# Altium footprint library LTEWlib.PcbLib: 125 footprints (part 3 of 8)
Each footprint in its own frame and in the unit in brackets; x right, y up, seen from the top. Pads: shape width x height; smd on the part's side, far side on the other; paste and mask are expansions set on the pad; w line width, h text height; cw(c..) or ccw(c..) is an arc to the next point about the centre after c.
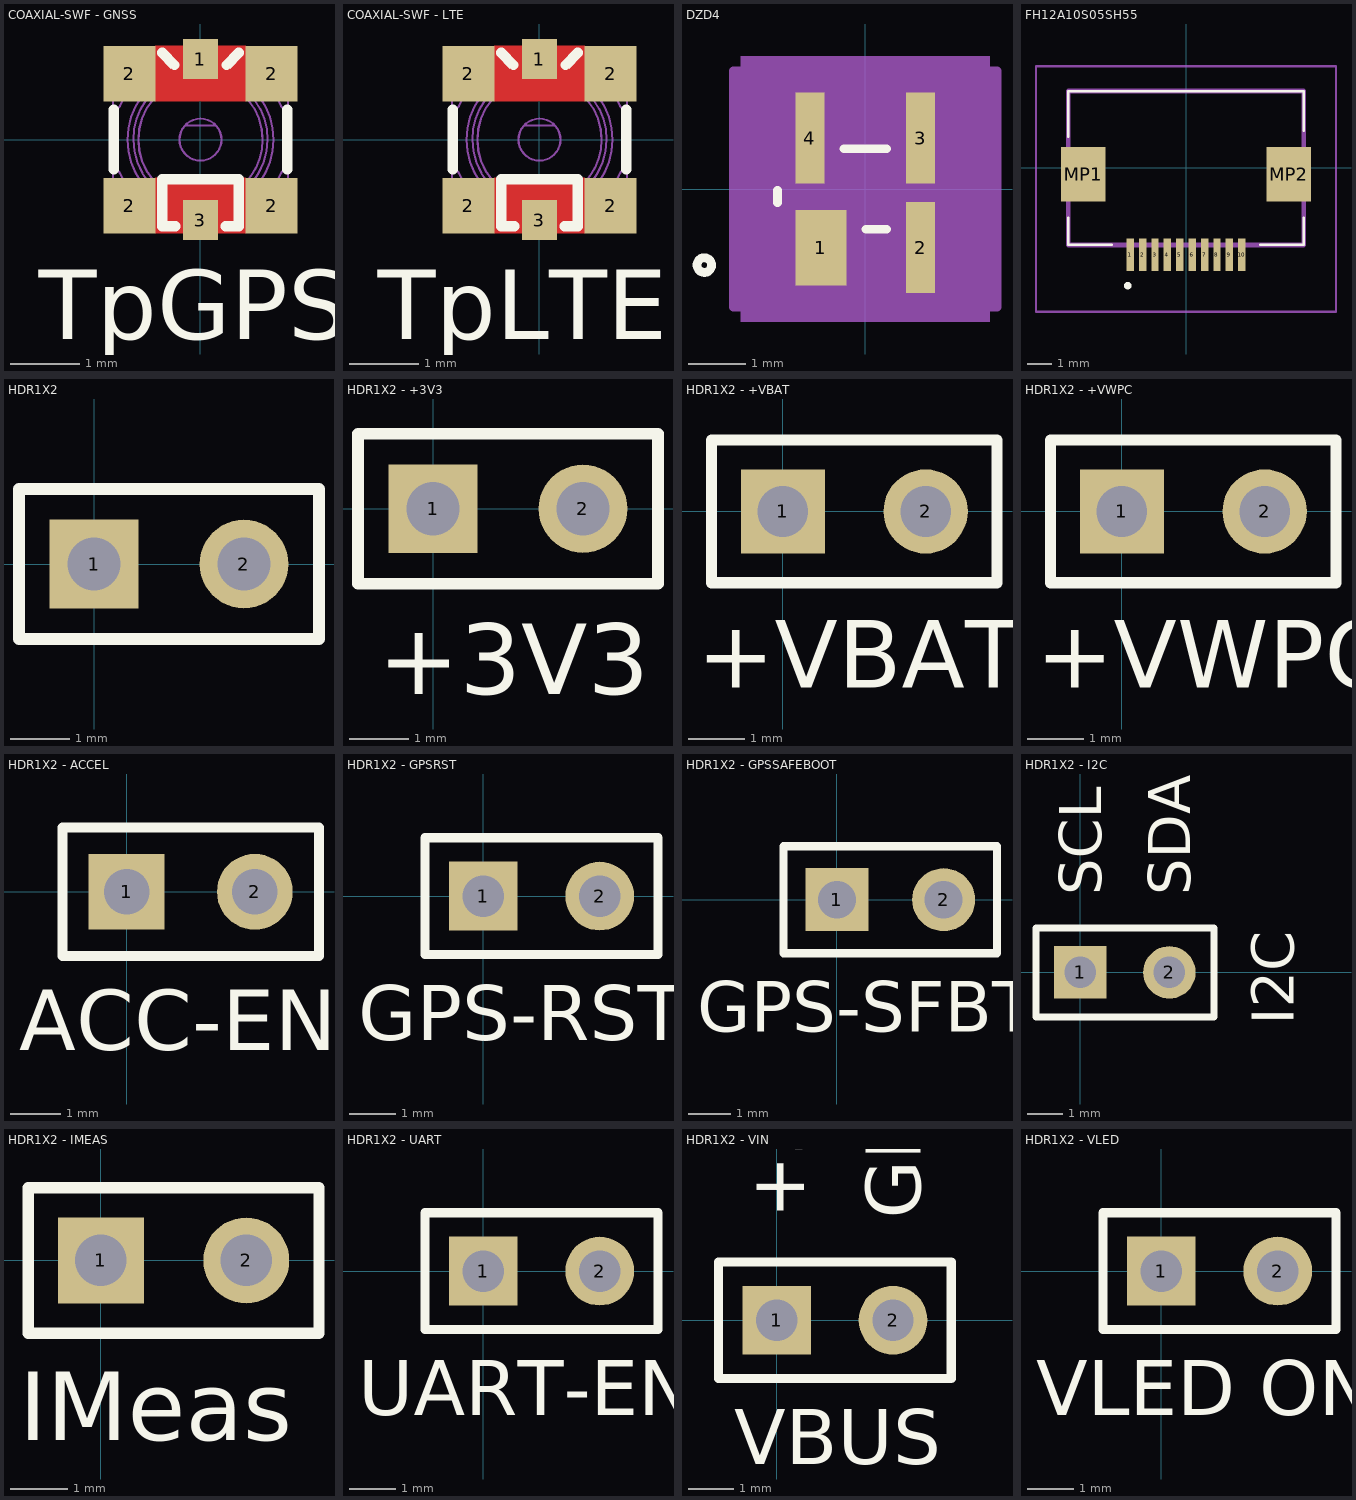
[diagram p2: the footprints below, top view; thin cyan lines are the x and y axes]

## COAXIAL-SWF - GNSS [mm]
pads (6):
  rect 0.5x0.58 smd: 1(0,1.16) 3(0,-1.16)
  rect 0.75x0.8 smd: 2(-1.025,-0.95) 2(-1.025,0.95) 2(1.025,-0.95) 2(1.025,0.95)
Top Layer:
  pour cut-out: -0.65,0.55 0.65,0.55 0.65,1.35 -0.65,1.35
  pour cut-out: 0.65,-0.55 -0.65,-0.55 -0.65,-1.35 0.65,-1.35
Top Overlay:
  lines w0.15: -1.25,-0.43 -1.25,0.43 ; -0.55,1.25 -0.375,1.075 ; -0.36,-1.25 -0.55,-1.25 -0.55,-0.57 0.55,-0.57 0.55,-1.25 0.36,-1.25 ; 0.375,1.075 0.55,1.25 ; 1.25,-0.43 1.25,0.43
  text "TpGPS" at -2.333,-2.873 h1
Mechanical 7:
  drawing of 206 lines, arcs and shapes, not listed
  text ".Designator" at -0.785,-0.7 h0.38
3D body: height 0.15, standoff 0, extent -0.227,-1.301 0.227,-0.758
3D body: height 0.15, standoff 0, extent -0.227,0.899 0.227,1.299
3D body: height 0.6, standoff 0.55, extent -1.262,-1.248 1.262,1.251
3D body: height 1.4, standoff 0.6, extent -0.9,-0.9 0.9,0.901
3D body: height 0.75, standoff 0.6, extent -1.05,-1.049 1.05,1.05
3D body: height 0.95, standoff 0.75, extent -1,-0.999 1,1.001
3D body: height 0.6, standoff 0, extent 0.757,0.655 1.262,1.249
3D body: height 0.6, standoff 0, extent 0.757,-1.246 1.262,-0.653
3D body: height 0.6, standoff 0, extent -1.262,-1.25 -0.757,-0.649
3D body: height 0.6, standoff 0, extent -1.262,0.655 -0.757,1.248
3D body: height 0.55, standoff 0.1, extent -1.262,-1.252 1.262,1.253
3D body: height 0.9, standoff 0.6, extent -1.05,-1.049 1.05,1.05
3D body: height 1.25, standoff 0.95, extent -1.05,-1.049 1.05,1.05
3D body: height 1.55, standoff 1.25, extent -1.05,-1.05 1.05,1.05

## COAXIAL-SWF - LTE [mm]
pads (6):
  rect 0.5x0.58 smd: 1(0,1.16) 3(0,-1.16)
  rect 0.75x0.8 smd: 2(-1.025,-0.95) 2(-1.025,0.95) 2(1.025,-0.95) 2(1.025,0.95)
Top Layer:
  pour cut-out: 0.65,-0.55 -0.65,-0.55 -0.65,-1.35 0.65,-1.35
  pour cut-out: -0.65,0.55 0.65,0.55 0.65,1.35 -0.65,1.35
Top Overlay:
  lines w0.15: -1.25,-0.43 -1.25,0.43 ; -0.55,1.25 -0.375,1.075 ; -0.36,-1.25 -0.55,-1.25 -0.55,-0.57 0.55,-0.57 0.55,-1.25 0.36,-1.25 ; 0.375,1.075 0.55,1.25 ; 1.25,-0.43 1.25,0.43
  text "TpLTE" at -2.333,-2.873 h1
Mechanical 7:
  drawing of 206 lines, arcs and shapes, not listed
  text ".Designator" at -0.785,-0.7 h0.38
3D body: height 1.55, standoff 1.25, extent -1.05,-1.05 1.05,1.05
3D body: height 1.25, standoff 0.95, extent -1.05,-1.049 1.05,1.05
3D body: height 0.9, standoff 0.6, extent -1.05,-1.049 1.05,1.05
3D body: height 0.55, standoff 0.1, extent -1.262,-1.252 1.262,1.253
3D body: height 0.6, standoff 0, extent -1.262,0.655 -0.757,1.248
3D body: height 0.6, standoff 0, extent -1.262,-1.25 -0.757,-0.649
3D body: height 0.6, standoff 0, extent 0.757,-1.246 1.262,-0.653
3D body: height 0.6, standoff 0, extent 0.757,0.655 1.262,1.249
3D body: height 0.95, standoff 0.75, extent -1,-0.999 1,1.001
3D body: height 0.75, standoff 0.6, extent -1.05,-1.049 1.05,1.05
3D body: height 1.4, standoff 0.6, extent -0.9,-0.9 0.9,0.901
3D body: height 0.6, standoff 0.55, extent -1.262,-1.248 1.262,1.251
3D body: height 0.15, standoff 0, extent -0.227,0.899 0.227,1.299
3D body: height 0.15, standoff 0, extent -0.227,-1.301 0.227,-0.758

## DZD4 [mil]
pads (4):
  rect 35x51.56 smd paste+0 mask+0: 1(-30.3,-40)
  rect 20x62.06 smd paste+0 mask+0: 2(37.8,-40) 3(37.8,34.75) 4(-37.8,34.75)
Top Overlay:
  circle w6: c-110,-52 r5
  lines w6: -60,-9.46 -60,-1.04 ; -14.7,27.5 14.7,27.5 ; 0.3,-27.5 14.7,-27.5
Mechanical 5:
  region: -85,90.78 85,90.78 85,-90.78 -85,-90.78
Mechanical 13:
  circle w0: c-50,-17.5 r5
  lines w1: -60,-27.5 60,-27.5 60,27.5 -60,27.5 -60,-27.5 ; -47.8,-52 -47.8,-27.5 -12.8,-27.5 -12.8,-52 -47.8,-52 ; -47.8,27.5 -27.8,27.5 -27.8,52 -47.8,52 -47.8,27.5 ; 27.8,-52 27.8,-27.5 47.8,-27.5 47.8,-52 27.8,-52 ; 27.8,27.5 47.8,27.5 47.8,52 27.8,52 27.8,27.5
Mechanical 15:
  region: -90,-80.78 -90,80.78 90,80.78 90,-80.78
  lines w6: -90,-80.78 90,-80.78 90,80.78 -90,80.78 -90,-80.78
3D body "DZD4.step": height 48.11, standoff 0, extent -60,-52.01 60,52.01

## FH12A10S05SH55 [mm]
pads (12):
  rect 0.3x1.3 smd: 1(-2.25,-3.5) 2(-1.75,-3.5) 3(-1.25,-3.5) 4(-0.75,-3.5) 5(-0.25,-3.5) 6(0.25,-3.5) 7(0.75,-3.5) 8(1.25,-3.5) 9(1.75,-3.5) 10(2.25,-3.5)
  rect 1.8x2.2 smd: MP1(-4.15,-0.25) MP2(4.15,-0.25)
Top Overlay:
  lines w0.1: -4.75,-3.1 -4.75,-2 -4.75,-3.1 ; -4.75,-3.1 -3,-3.1 -4.75,-3.1 ; -4.75,3.1 4.75,3.1 ; -4.75,3.1 4.75,3.1 ; -4.75,3.1 -4.75,1.25 -4.75,3.1 ; 4.75,-3.1 3,-3.1 4.75,-3.1 ; 4.75,-3.1 4.75,-2 4.75,-3.1 ; 4.75,3.1 4.75,1.5 4.75,3.1
  lines w0.2: -2.4,-4.75 ccw(c-2.35,-4.75) -2.3,-4.75 ; -2.4,-4.75 cw(c-2.35,-4.75) -2.3,-4.75 ; -2.4,-4.75 ccw(c-2.35,-4.75) -2.3,-4.75
Mechanical 13:
  lines w0.2: -4.75,-3.1 -4.75,3.1 4.75,3.1 4.75,-3.1 -4.75,-3.1
Mechanical 15:
  lines w0.1: -6.05,-5.8 -6.05,4.1 6.05,4.1 6.05,-5.8 -6.05,-5.8
3D body "FH12A-10S-0.5SH_55_.stp": height 3.7, standoff 0, extent -4.87,-4.12 4.87,3.1

## HDR1X2 [mm] "Connector; Header; 2 Position"
pads (2):
  rect 1.5x1.5 hole 0.9: 1(0,0)
  round 1.5 hole 0.9: 2(2.54,0)
Top Overlay:
  lines w0.2: -1.27,-1.27 -1.27,1.27 3.81,1.27 3.81,-1.27 -1.27,-1.27

## HDR1X2 - +3V3 [mm] "Connector; Header; 2 Position"
pads (2):
  rect 1.5x1.5 hole 0.9: 1(0,0)
  round 1.5 hole 0.9: 2(2.54,0)
Top Overlay:
  lines w0.2: -1.27,-1.27 3.81,-1.27 3.81,1.27 -1.27,1.27 -1.27,-1.27
  text "+3V3" at -0.929,-3.14 h1.2

## HDR1X2 - +VBAT [mm] "Connector; Header; 2 Position"
pads (2):
  rect 1.5x1.5 hole 0.9: 1(0,0)
  round 1.5 hole 0.9: 2(2.54,0)
Top Overlay:
  lines w0.2: -1.27,-1.27 3.81,-1.27 3.81,1.27 -1.27,1.27 -1.27,-1.27
  text "+VBAT" at -1.529,-3.14 h1.2

## HDR1X2 - +VWPC [mm] "Connector; Header; 2 Position"
pads (2):
  rect 1.5x1.5 hole 0.9: 1(0,0)
  round 1.5 hole 0.9: 2(2.54,0)
Top Overlay:
  lines w0.2: -1.27,-1.27 3.81,-1.27 3.81,1.27 -1.27,1.27 -1.27,-1.27
  text "+VWPC" at -1.529,-3.14 h1.2

## HDR1X2 - ACCEL [mm] "Connector; Header; 2 Position"
pads (2):
  rect 1.5x1.5 hole 0.9: 1(0,0)
  round 1.5 hole 0.9: 2(2.54,0)
Top Overlay:
  lines w0.2: -1.27,-1.27 3.81,-1.27 3.81,1.27 -1.27,1.27 -1.27,-1.27
  text "ACC-EN" at -2.129,-3.14 h1.2

## HDR1X2 - GPSRST [mm] "Connector; Header; 2 Position"
pads (2):
  rect 1.5x1.5 hole 0.9: 1(0,0)
  round 1.5 hole 0.9: 2(2.54,0)
Top Overlay:
  lines w0.2: -1.27,-1.27 -1.27,1.27 3.81,1.27 3.81,-1.27 -1.27,-1.27
  text "GPS-RST" at -2.729,-3.14 h1.2

## HDR1X2 - GPSSAFEBOOT [mm] "Connector; Header; 2 Position"
pads (2):
  rect 1.5x1.5 hole 0.9: 1(0,0)
  round 1.5 hole 0.9: 2(2.54,0)
Top Overlay:
  lines w0.2: -1.27,-1.27 3.81,-1.27 3.81,1.27 -1.27,1.27 -1.27,-1.27
  text "GPS-SFBT" at -3.329,-3.14 h1.2

## HDR1X2 - I2C [mm] "Connector; Header; 2 Position"
pads (2):
  rect 1.5x1.5 hole 0.9: 1(0,0)
  round 1.5 hole 0.9: 2(2.54,0)
Top Overlay:
  lines w0.2: -1.27,-1.27 -1.27,1.27 3.81,1.27 3.81,-1.27 -1.27,-1.27
  text "I2C" at 6.096,-1.5 h1.2
  text "SCL" at 0.6,2.211 h1.2
  text "SDA" at 3.14,2.211 h1.2

## HDR1X2 - IMEAS [mm] "Connector; Header; 2 Position"
pads (2):
  rect 1.5x1.5 hole 0.9: 1(0,0)
  round 1.5 hole 0.9: 2(2.54,0)
Top Overlay:
  lines w0.2: -1.27,-1.27 -1.27,1.27 3.81,1.27 3.81,-1.27 -1.27,-1.27
  text "IMeas" at -1.429,-3.14 h1.2

## HDR1X2 - UART [mm] "Connector; Header; 2 Position"
pads (2):
  rect 1.5x1.5 hole 0.9: 1(0,0)
  round 1.5 hole 0.9: 2(2.54,0)
Top Overlay:
  lines w0.2: -1.27,-1.27 3.81,-1.27 3.81,1.27 -1.27,1.27 -1.27,-1.27
  text "UART-EN" at -2.729,-3.14 h1.2

## HDR1X2 - VIN [mm] "Connector; Header; 2 Position"
pads (2):
  rect 1.5x1.5 hole 0.9: 1(0,0)
  round 1.5 hole 0.9: 2(2.54,0)
Top Overlay:
  lines w0.2: -1.27,-1.27 3.81,-1.27 3.81,1.27 -1.27,1.27 -1.27,-1.27
  text "VBUS" at -0.929,-3.14 h1.2
  text "+5V" at 0.6,2.211 h1.2
  text "GND" at 3.14,2.211 h1.2

## HDR1X2 - VLED [mm] "Connector; Header; 2 Position"
pads (2):
  rect 1.5x1.5 hole 0.9: 1(0,0)
  round 1.5 hole 0.9: 2(2.54,0)
Top Overlay:
  lines w0.2: -1.27,-1.27 3.81,-1.27 3.81,1.27 -1.27,1.27 -1.27,-1.27
  text "VLED ON" at -2.729,-3.14 h1.2